# Altium footprint library General.PcbLib: 446 footprints (part 1 of 28)
Each footprint in its own frame and in the unit in brackets; x right, y up, seen from the top. Pads: shape width x height; smd on the part's side, far side on the other; paste and mask are expansions set on the pad; w line width, h text height; cw(c..) or ccw(c..) is an arc to the next point about the centre after c.
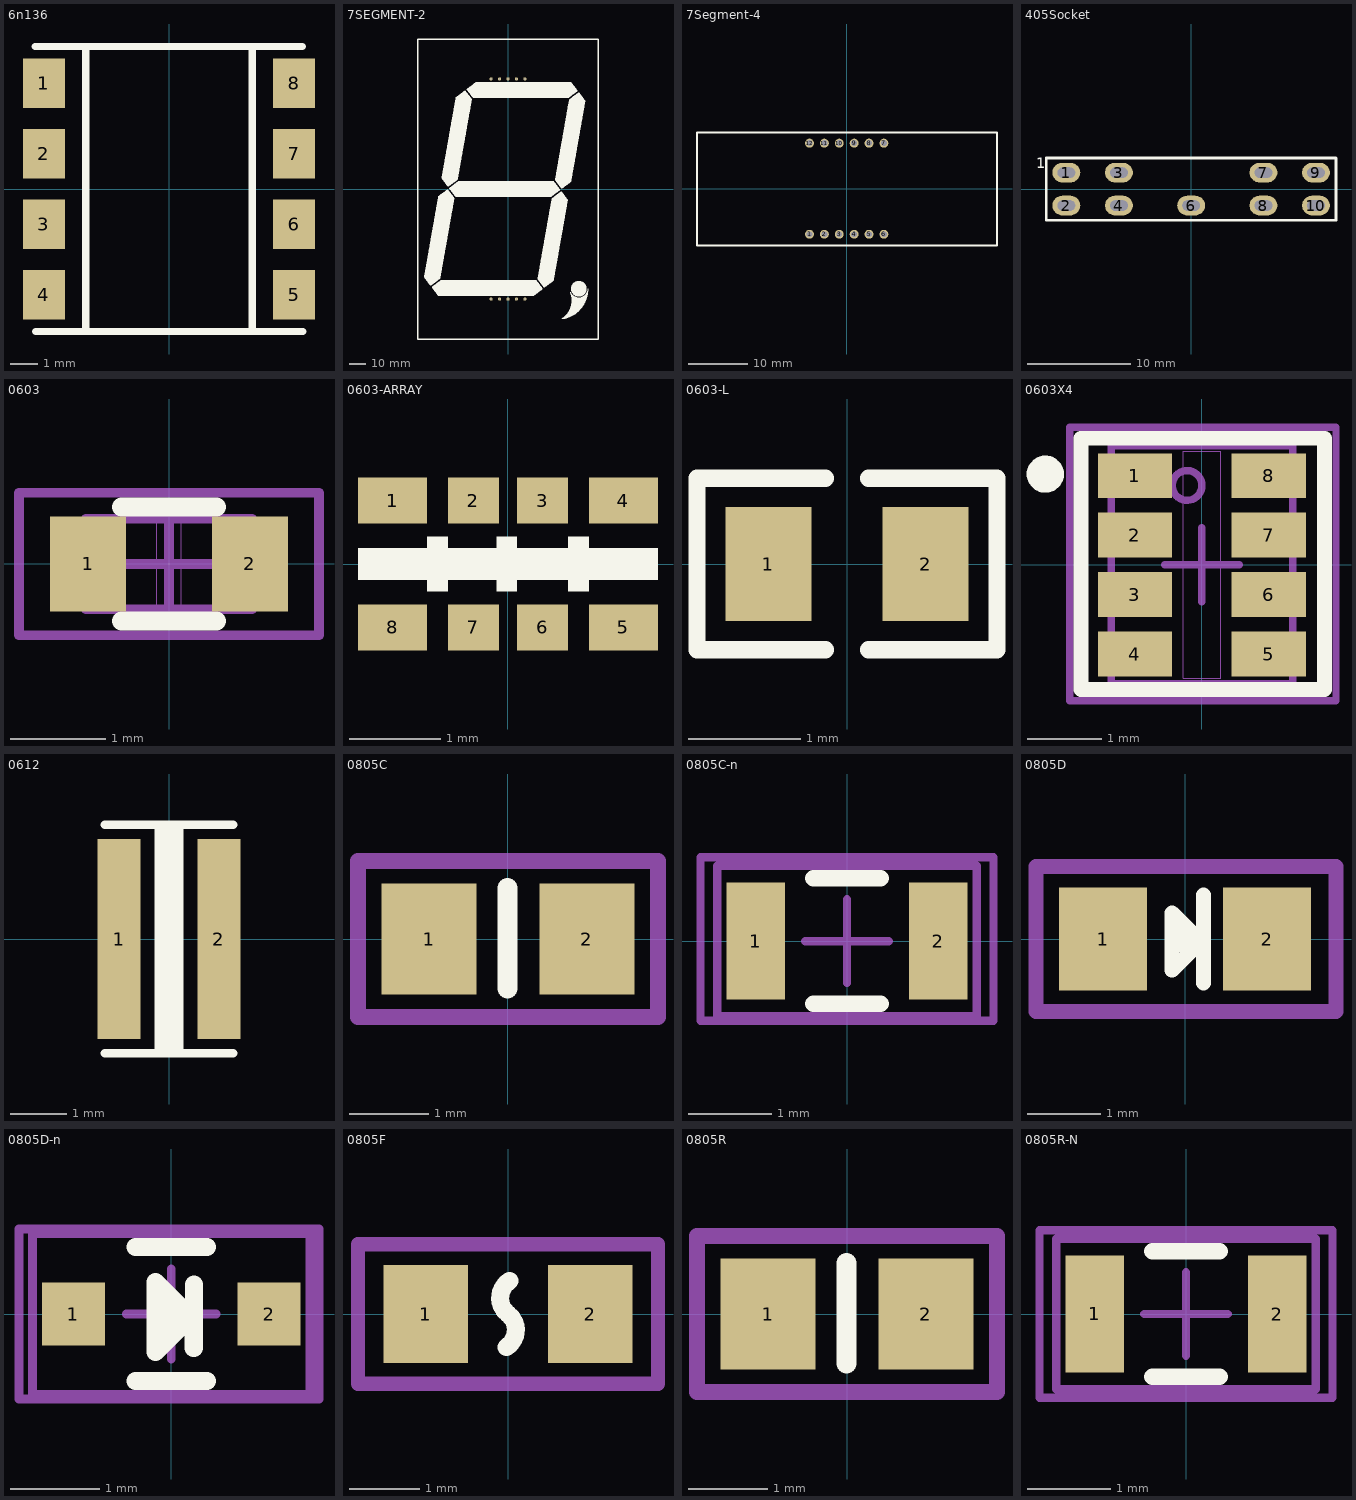
[diagram p0: the footprints below, top view; thin cyan lines are the x and y axes]

## 6n136 [mm] "OPTOTRANSISTOR-FAST"
pads (8):
  rect 1.52x1.8 smd: 1(-4.505,3.81) 2(-4.505,1.27) 3(-4.505,-1.27) 4(-4.505,-3.81) 5(4.505,-3.81) 6(4.505,-1.27) 7(4.505,1.27) 8(4.505,3.81)
Top Overlay:
  lines w0.254: -4.835,5.131 4.817,5.131 ; -4.817,-5.131 4.835,-5.131 ; -3,-5.131 -3,5 ; 3,-5 3,5.131
3D body "8-pin-DIP_GW_HCPL-4200-300E.step": height 4.25, standoff -0.08, extent -4.985,-4.978 4.915,4.922

## 7SEGMENT-2 [mm]
pads (10):
  round 2 hole 0.85: 1(-10.16,-66.002) 2(-5.08,-66.002) 3(0,-66.002) 4(5.08,-66.002) 5(10.16,-66.002) 6(10.16,66.002) 7(5.08,66.002) 8(0,66.002) 9(-5.08,66.002) 10(-10.16,66.002)
Top Overlay:
  drawing of 13 lines, arcs and shapes, not listed
3D body "7Segment.STEP": height 15.6, standoff -4.3, extent -54.01,-90.002 53.99,89.998

## 7Segment-4 [mm]
pads (12):
  round 1.5 hole 1: 1(-6.25,-7.65) 2(-3.75,-7.65) 3(-1.25,-7.65) 4(1.25,-7.65) 5(3.75,-7.65) 6(6.25,-7.65) 7(6.25,7.65) 8(3.75,7.65) 9(1.25,7.65) 10(-1.25,7.65) 11(-3.75,7.65) 12(-6.25,7.65)
Top Overlay:
  lines w0.349: -25.15,-9.55 -25.15,9.45 25.25,9.45 25.25,-9.55 -25.15,-9.55
3D body "User Library-C-564 (7 segment 4 digit LED display).STEP": height 8, standoff -6.2, extent -25.15,-9.55 25.25,9.45

## 405Socket [mm]
pads (9):
  oval 2.7x1.9 hole 1 slot 1.7 at 0 deg: 1(-12.065,1.587) 2(-12.065,-1.587) 3(-6.985,1.587) 4(-6.985,-1.587) 6(0,-1.587) 7(6.985,1.587) 8(6.985,-1.587) 9(12.065,1.587) 10(12.065,-1.587)
Top Overlay:
  lines w0.254: -14,-3 14,-3 14,3 -14,3 -14,-3
  text "1" at -15,2 h1.02

## 0603 [mm] "Chip Resistor, 2-Leads, Body 1.6x0.8mm, IPC Medium Density"
height 0.8
pads (2):
  rect 0.8x1 smd: 1(-0.85,0) 2(0.85,0)
Top Overlay:
  lines w0.2: -0.5,-0.6 0.5,-0.6 ; -0.5,0.6 0.5,0.6
Mechanical 10:
  lines w0.01: -0.127,-0.508 0.102,-0.508 0.127,-0.533 0.127,0.508 -0.127,0.508 -0.127,-0.508
Mechanical 13:
  lines w0.1: -0.875,-0.475 0.875,-0.475 0.875,0.475 -0.875,0.475 -0.875,-0.475
Mechanical 15:
  lines w0.1: -0.475,0 0.475,0 ; 0,-0.475 0,0.475 ; -1.575,-0.75 1.575,-0.75 1.575,0.75 -1.575,0.75 -1.575,-0.75
3D body "SW3dPS-R0603.STEP": height 0.37, standoff 0, extent -0.775,-0.406 0.825,0.396

## 0603-ARRAY [mil]
pads (8):
  rect 30x20 smd: 1(-50,27.5) 4(50,27.5) 5(50,-27.5) 8(-50,-27.5)
  rect 22x20 smd: 2(-15,27.5) 3(15,27.5) 6(15,-27.5) 7(-15,-27.5)
Top Overlay:
  rectangle: -65,-7 65,7
  rectangle: -35,-12 -26,12
  rectangle: -5,-12 4,12
  region: 35,12 26,12 26,-12 35,-12

## 0603-L [mil]
pads (2):
  rect 30x40 smd: 1(-27.5,0) 2(27.5,0)
Top Overlay:
  lines w6: -7.5,-30 -52.5,-30 -52.5,30 -7.5,30 ; 7.5,-30 52.5,-30 52.5,30 7.5,30

## 0603X4 [mm] "Resistor Array ,8-Leads, Body 3.2x1.0mm (max), Pitch 0.80mm, IPC Medium Density"
height 0.5
pads (8):
  rect 1x0.6 smd: 1(-0.9,1.2) 2(-0.9,0.4) 3(-0.9,-0.4) 4(-0.9,-1.2) 5(0.9,-1.2) 6(0.9,-0.4) 7(0.9,0.4) 8(0.9,1.2)
Top Overlay:
  circle w0.25: c-2.106,1.219 r0.125
  lines w0.2: -1.626,-1.676 1.651,-1.676 1.651,1.702 -1.626,1.702 -1.626,-1.676
Mechanical 10:
  lines w0.01: -0.254,-1.524 -0.254,1.524 0.254,1.524 0.254,-1.524 -0.254,-1.524
Mechanical 13:
  circle w0.1: c-0.2,1.067 r0.2
  lines w0.1: -1.219,-1.6 1.219,-1.6 1.219,1.6 -1.219,1.6 -1.219,-1.6
Mechanical 15:
  lines w0.1: -0.5,0 0.5,0 ; 0,-0.5 0,0.5 ; -1.778,-1.829 1.803,-1.829 1.803,1.85 -1.778,1.85 -1.778,-1.829
3D body: height 0.5, standoff 0, extent -1.219,-1.6 1.219,1.6

## 0612 [mil]
pads (2):
  rect 30x140 smd: 1(-35,0) 2(35,0)
Top Overlay:
  rectangle: -10,-80 10,80
  lines w6: -45,-80 45,-80 ; -45,80 45,80

## 0805C [mm]
pads (2):
  rect 1.2x1.4 smd: 1(-1,0) 2(1,0)
Top Overlay:
  lines w0.254: -0.006,-0.625 -0.006,0.645
Mechanical 15:
  lines w0.203: -1.9,-0.991 -1.9,0.991 1.9,0.991 1.9,-0.991 -1.9,-0.991
3D body "0805 SMD Capacitor.STEP": height 0.78, standoff 0, extent -1.006,-0.625 0.994,0.625

## 0805C-n [mm]
pads (2):
  rect 0.7x1.4 smd: 1(-1.092,0) 2(1.092,0)
Top Overlay:
  lines w0.2: -0.4,-0.75 0.4,-0.75 ; -0.4,0.75 0.4,0.75
Mechanical 13:
  lines w0.1: -1.55,-0.9 -1.55,0.9 1.55,0.9 1.55,-0.9 -1.55,-0.9
Mechanical 15:
  lines w0.1: -0.5,0 0.5,0 ; 0,-0.5 0,0.5 ; -1.75,-0.95 -1.75,1 1.75,1 1.75,-0.95 -1.75,-0.95
3D body "0805 SMD Capacitor.STEP": height 0.78, standoff 0, extent -1,-0.625 1,0.625

## 0805D [mm]
pads (2):
  rect 1.2x1.4 smd: 1(-1.118,0) 2(1.118,0)
Top Overlay:
  lines w0.203: 0.205,-0.045 -0.176,-0.426 -0.176,0.356 0.205,-0.025 ; 0.25,-0.6 0.25,0.6
  lines w0.305: -0.12,-0.025 0.162,-0.025
Mechanical 15:
  lines w0.203: -2.032,-0.991 -2.032,0.991 2.057,0.991 2.057,-0.991 -2.032,-0.991
3D body "User Library-LED0805.step": height 0.8, standoff 0, extent -1.126,-0.686 0.974,0.664

## 0805D-n [mm]
pads (2):
  rect 0.7x0.7 smd: 1(-1.092,0) 2(1.092,0)
Top Overlay:
  lines w0.2: -0.4,-0.75 0.4,-0.75 ; -0.4,0.75 0.4,0.75
  lines w0.203: 0.205,-0.045 -0.176,-0.426 -0.176,0.356 0.205,-0.025 ; 0.251,-0.381 0.254,0.33
  lines w0.305: -0.12,-0.025 0.162,-0.025
Mechanical 13:
  lines w0.1: -1.55,-0.9 -1.55,0.9 1.55,0.9 1.55,-0.9 -1.55,-0.9
Mechanical 15:
  lines w0.1: -0.5,0 0.5,0 ; 0,-0.5 0,0.5 ; -1.7,-0.95 -1.7,0.95 1.65,0.95 1.65,-0.95 -1.7,-0.95
3D body "User Library-LED0805.step": height 0.8, standoff 0, extent -1.084,-0.686 1.016,0.664

## 0805F [mm]
pads (2):
  rect 1.2x1.4 smd: 1(-1.168,0) 2(1.168,0)
Top Overlay:
  lines w0.254: -0.024,-0.473 ccw(c-0.177,-0.228) 0,0 cw(c0.177,0.228) 0.024,0.473
Mechanical 15:
  lines w0.203: -2.134,-0.991 -2.134,0.991 2.134,0.991 2.134,-0.991 -2.134,-0.991
3D body "User Library-fuse0805L050WR.step": height 1.24, standoff 0, extent -1.13,-0.749 1.08,0.75

## 0805R [mm]
pads (2):
  rect 1.2x1.4 smd: 1(-1,0) 2(1,0)
Top Overlay:
  lines w0.254: -0.006,-0.625 -0.006,0.645
Mechanical 15:
  lines w0.203: -1.9,-0.991 1.9,-0.991 1.9,0.991 -1.9,0.991 -1.9,-0.991
3D body "User Library-0805 SMD Resistor.step": height 0.78, standoff 0, extent -1.006,-0.625 0.994,0.625

## 0805R-N [mm]
pads (2):
  rect 0.7x1.4 smd: 1(-1.092,0) 2(1.092,0)
Top Overlay:
  lines w0.2: -0.4,-0.75 0.4,-0.75 ; -0.4,0.75 0.4,0.75
Mechanical 13:
  lines w0.1: -1.55,-0.9 1.55,-0.9 1.55,0.9 -1.55,0.9 -1.55,-0.9
Mechanical 15:
  lines w0.1: -0.5,0 0.5,0 ; 0,-0.5 0,0.5 ; -1.75,-1 1.75,-1 1.75,1 -1.75,1 -1.75,-1
3D body "SW3dPS-0805 SMD Resistor.STEP": height 0.78, standoff 0, extent -1,-0.625 1,0.625